# Altium footprint library AltiumDesignerLibraries.PcbLib: 313 footprints (part 16 of 20)
Each footprint in its own frame and in the unit in brackets; x right, y up, seen from the top. Pads: shape width x height; smd on the part's side, far side on the other; paste and mask are expansions set on the pad; w line width, h text height; cw(c..) or ccw(c..) is an arc to the next point about the centre after c.
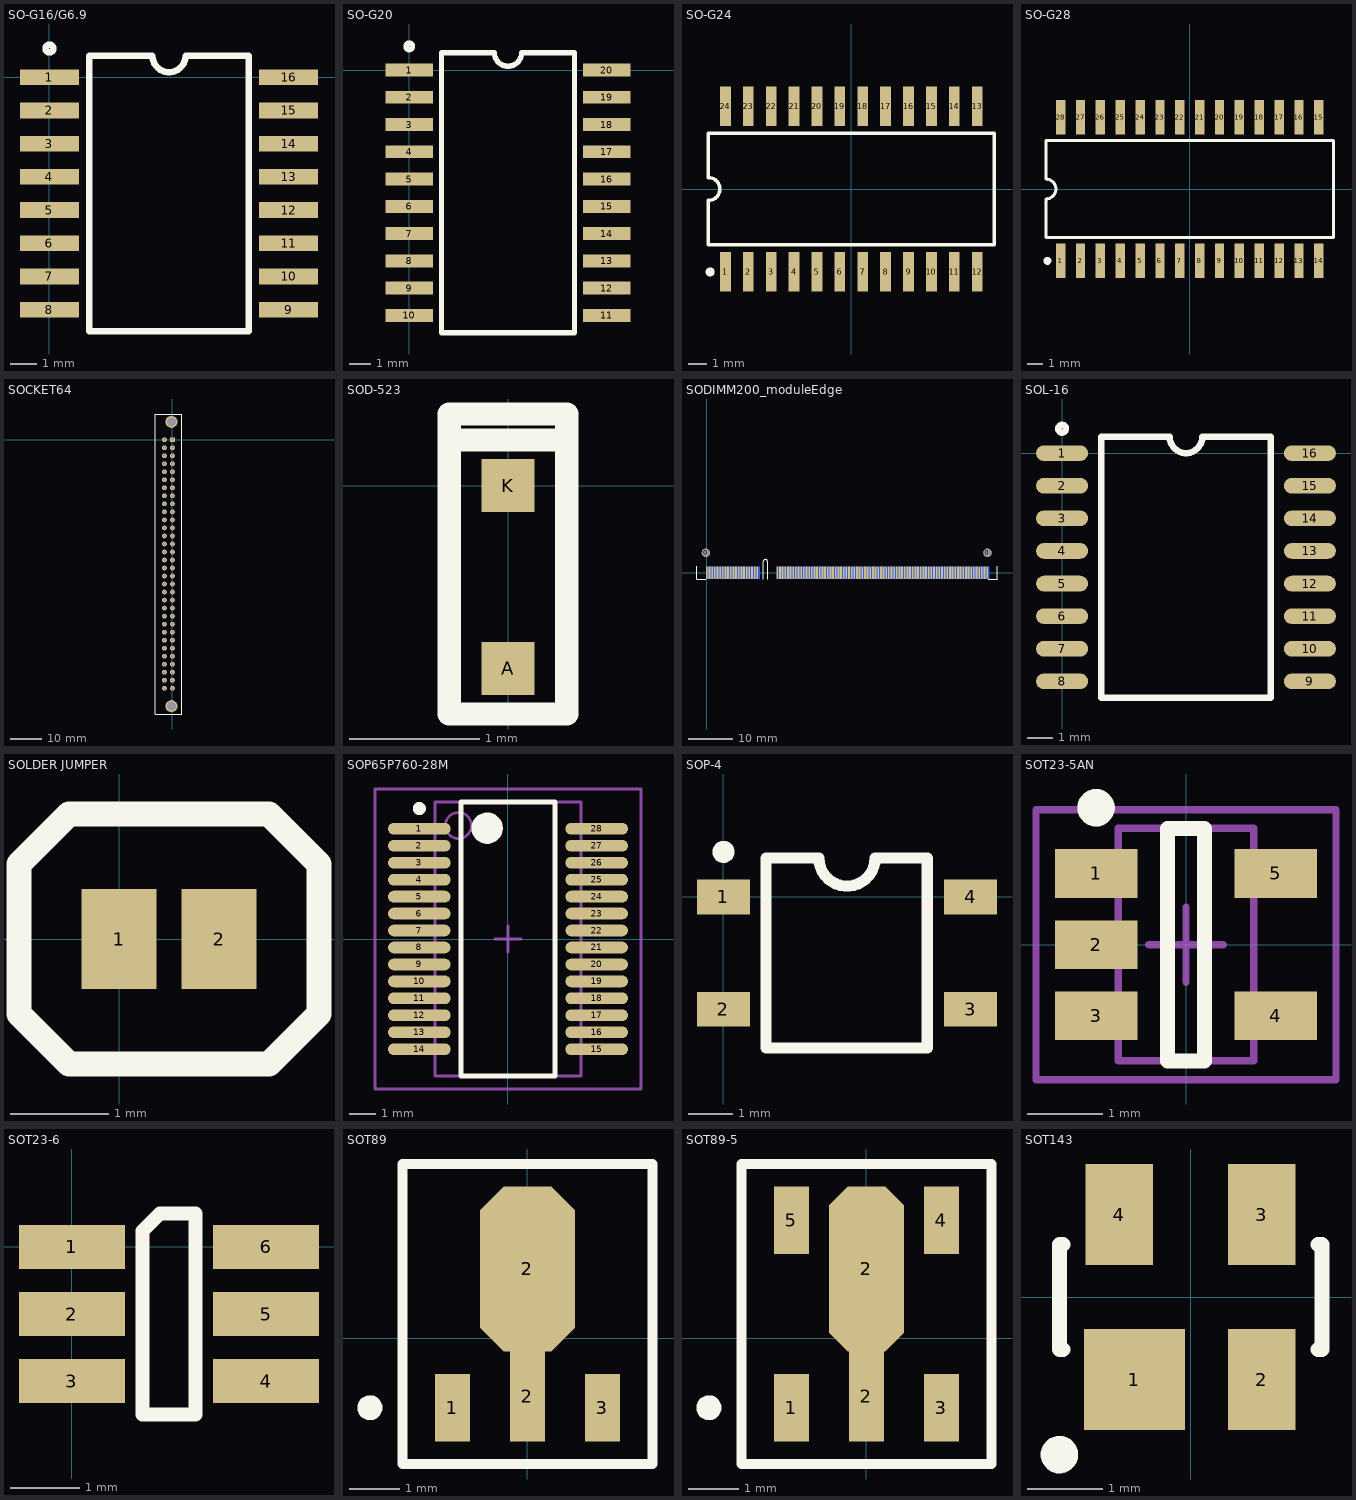
[diagram p15: the footprints below, top view; thin cyan lines are the x and y axes]

## SO-G16/G6.9 [mm]
pads (16):
  rect 2.25x0.6 smd: 1(0,0) 2(0,-1.27) 3(0,-2.54) 4(0,-3.81) 5(0,-5.08) 6(0,-6.35) 7(0,-7.62) 8(0,-8.89) 9(9.15,-8.89) 10(9.15,-7.62) 11(9.15,-6.35) 12(9.15,-5.08) 13(9.15,-3.81) 14(9.15,-2.54) 15(9.15,-1.27) 16(9.15,0)
Top Overlay:
  circle w0.25: c0,1.1 r0.15
  lines w0.25: 1.525,-9.72 1.525,0.83 3.94,0.83 ccw(c4.575,0.83) 5.21,0.83 7.625,0.83 7.625,-9.72 1.525,-9.72

## SO-G20 [mm]
pads (20):
  rect 2.2x0.6 smd: 1(0,0) 2(0,-1.27) 3(0,-2.54) 4(0,-3.81) 5(0,-5.08) 6(0,-6.35) 7(0,-7.62) 8(0,-8.89) 9(0,-10.16) 10(0,-11.43) 11(9.2,-11.43) 12(9.2,-10.16) 13(9.2,-8.89) 14(9.2,-7.62) 15(9.2,-6.35) 16(9.2,-5.08) 17(9.2,-3.81) 18(9.2,-2.54) 19(9.2,-1.27) 20(9.2,0)
Top Overlay:
  circle w0.25: c0,1.1 r0.15
  lines w0.25: 1.5,-12.24 7.7,-12.24 7.7,0.81 5.235,0.81 cw(c4.6,0.81) 3.965,0.81 1.5,0.81 1.5,-12.24

## SO-G24 [mm]
pads (24):
  rect 0.6x2.2 smd: 1(-6.985,-4.6) 2(-5.715,-4.6) 3(-4.445,-4.6) 4(-3.175,-4.6) 5(-1.905,-4.6) 6(-0.635,-4.6) 7(0.635,-4.6) 8(1.905,-4.6) 9(3.175,-4.6) 10(4.445,-4.6) 11(5.715,-4.6) 12(6.985,-4.6) 13(6.985,4.6) 14(5.715,4.6) 15(4.445,4.6) 16(3.175,4.6) 17(1.905,4.6) 18(0.635,4.6) 19(-0.635,4.6) 20(-1.905,4.6) 21(-3.175,4.6) 22(-4.445,4.6) 23(-5.715,4.6) 24(-6.985,4.6)
Top Overlay:
  circle w0.25: c-7.835,-4.6 r0.125
  lines w0.2: -7.925,-3.1 7.925,-3.1 7.925,3.1 -7.925,3.1 -7.925,0.635 cw(c-7.925,0) -7.925,-0.635 -7.925,-3.1

## SO-G28 [mm]
pads (28):
  rect 0.6x2.2 smd: 1(-8.255,-4.6) 2(-6.985,-4.6) 3(-5.715,-4.6) 4(-4.445,-4.6) 5(-3.175,-4.6) 6(-1.905,-4.6) 7(-0.635,-4.6) 8(0.635,-4.6) 9(1.905,-4.6) 10(3.175,-4.6) 11(4.445,-4.6) 12(5.715,-4.6) 13(6.985,-4.6) 14(8.255,-4.6) 15(8.255,4.6) 16(6.985,4.6) 17(5.715,4.6) 18(4.445,4.6) 19(3.175,4.6) 20(1.905,4.6) 21(0.635,4.6) 22(-0.635,4.6) 23(-1.905,4.6) 24(-3.175,4.6) 25(-4.445,4.6) 26(-5.715,4.6) 27(-6.985,4.6) 28(-8.255,4.6)
Top Overlay:
  circle w0.25: c-9.105,-4.6 r0.125
  lines w0.2: -9.2,-3.1 -9.2,-0.635 ccw(c-9.2,0) -9.2,0.635 -9.2,3.1 9.2,3.1 9.2,-3.1 -9.2,-3.1

## SOCKET64 [mil]
pads (66):
  rect 60x60 hole 38: 1(0,0)
  round 60 hole 38: 2(0,-100) 3(0,-200) 4(0,-300) 5(0,-400) 6(0,-500) 7(0,-600) 8(0,-700) 9(0,-800) 10(0,-900) 11(0,-1000) 12(0,-1100) 13(0,-1200) 14(0,-1300) 15(0,-1400) 16(0,-1500) 17(0,-1600) 18(0,-1700) 19(0,-1800) 20(0,-1900) 21(0,-2000) 22(0,-2100) 23(0,-2200) 24(0,-2300) 25(0,-2400) 26(0,-2500) 27(0,-2600) 28(0,-2700) 29(0,-2800) 30(0,-2900) 31(0,-3000) 32(0,-3100) 33(-100,0) 34(-100,-100) 35(-100,-200) 36(-100,-300) 37(-100,-400) 38(-100,-500) 39(-100,-600) 40(-100,-700) 41(-100,-800) 42(-100,-900) 43(-100,-1000) 44(-100,-1100) 45(-100,-1200) 46(-100,-1300) 47(-100,-1400) 48(-100,-1500) 49(-100,-1600) 50(-100,-1700) 51(-100,-1800) 52(-100,-1900) 53(-100,-2000) 54(-100,-2100) 55(-100,-2200) 56(-100,-2300) 57(-100,-2400) 58(-100,-2500) 59(-100,-2600) 60(-100,-2700) 61(-100,-2800) 62(-100,-2900) 63(-100,-3000) 64(-100,-3100)
  round 150 hole 110: SYSPAD65(-12,222) SYSPAD66(-12,-3322)
Top Overlay:
  lines w10: -216,-3420 116,-3420 116,320 -216,320 -216,-3420

## SOD-523 [mil]
height 39.37
pads (2):
  rect 16x16 smd mask+3: A(0,-55.12) K(0,0)
Top Overlay:
  lines w7: 17.72,11.81 17.72,21.65 -17.72,21.65 -17.72,13.78 ; -17.72,13.78 17.72,13.78 17.72,-68.9 -17.72,-68.9 -17.72,13.78

## SODIMM200_moduleEdge [mm]
pads (202):
  round 1.9 hole 1.8: 0(-0.225,4.5) 0(63.375,4.5)
  rect 0.4x2.769 smd: 1(0,0) 3(0.6,0) 5(1.2,0) 7(1.8,0) 9(2.4,0) 11(3,0) 13(3.6,0) 15(4.2,0) 17(4.8,0) 19(5.4,0) 21(6,0) 23(6.6,0) 25(7.2,0) 27(7.8,0) 29(8.4,0) 31(9,0) 33(9.6,0) 35(10.2,0) 37(10.8,0) 39(11.4,0) 41(15.9,0) 43(16.5,0) 45(17.1,0) 47(17.7,0) 49(18.3,0) 51(18.9,0) 53(19.5,0) 55(20.1,0) 57(20.7,0) 59(21.3,0) 61(21.9,0) 63(22.5,0) 65(23.1,0) 67(23.7,0) 69(24.3,0) 71(24.9,0) 73(25.5,0) 75(26.1,0) 77(26.7,0) 79(27.3,0) 81(27.9,0) 83(28.5,0) 85(29.1,0) 87(29.7,0) 89(30.3,0) 91(30.9,0) 93(31.5,0) 95(32.1,0) 97(32.7,0) 99(33.3,0) 101(33.9,0) 103(34.5,0) 105(35.1,0) 107(35.7,0) 109(36.3,0) 111(36.9,0) 113(37.5,0) 115(38.1,0) 117(38.7,0) 119(39.3,0) 121(39.9,0) 123(40.5,0) 125(41.1,0) 127(41.7,0) 129(42.3,0) 131(42.9,0) 133(43.5,0) 135(44.1,0) 137(44.7,0) 139(45.3,0) 141(45.9,0) 143(46.5,0) 145(47.1,0) 147(47.7,0) 149(48.3,0) 151(48.9,0) 153(49.5,0) 155(50.1,0) 157(50.7,0) 159(51.3,0) 161(51.9,0) 163(52.5,0) 165(53.1,0) 167(53.7,0) 169(54.3,0) 171(54.9,0) 173(55.5,0) 175(56.1,0) 177(56.7,0) 179(57.3,0) 181(57.9,0) 183(58.5,0) 185(59.1,0) 187(59.7,0) 189(60.3,0) 191(60.9,0) 193(61.5,0) 195(62.1,0) 197(62.7,0) 199(63.3,0)
  rect 0.4x2.769 smd far side: 2(0.305,0) 4(0.905,0) 6(1.505,0) 8(2.105,0) 10(2.705,0) 12(3.305,0) 14(3.905,0) 16(4.505,0) 18(5.105,0) 20(5.705,0) 22(6.305,0) 24(6.905,0) 26(7.505,0) 28(8.105,0) 30(8.705,0) 32(9.305,0) 34(9.905,0) 36(10.505,0) 38(11.105,0) 40(11.705,0) 42(16.205,0) 44(16.805,0) 46(17.405,0) 48(18.005,0) 50(18.605,0) 52(19.205,0) 54(19.805,0) 56(20.405,0) 58(21.005,0) 60(21.605,0) 62(22.205,0) 64(22.805,0) 66(23.405,0) 68(24.005,0) 70(24.605,0) 72(25.205,0) 74(25.805,0) 76(26.405,0) 78(27.005,0) 80(27.605,0) 82(28.205,0) 84(28.805,0) 86(29.405,0) 88(30.005,0) 90(30.605,0) 92(31.205,0) 94(31.805,0) 96(32.405,0) 98(33.005,0) 100(33.605,0) 102(34.205,0) 104(34.805,0) 106(35.405,0) 108(36.005,0) 110(36.605,0) 112(37.205,0) 114(37.805,0) 116(38.405,0) 118(39.005,0) 120(39.605,0) 122(40.205,0) 124(40.805,0) 126(41.405,0) 128(42.005,0) 130(42.605,0) 132(43.205,0) 134(43.805,0) 136(44.405,0) 138(45.005,0) 140(45.605,0) 142(46.205,0) 144(46.805,0) 146(47.405,0) 148(48.005,0) 150(48.605,0) 152(49.205,0) 154(49.805,0) 156(50.405,0) 158(51.005,0) 160(51.605,0) 162(52.205,0) 164(52.805,0) 166(53.405,0) 168(54.005,0) 170(54.605,0) 172(55.205,0) 174(55.805,0) 176(56.405,0) 178(57.005,0) 180(57.605,0) 182(58.205,0) 184(58.805,0) 186(59.405,0) 188(60.005,0) 190(60.605,0) 192(61.205,0) 194(61.805,0) 196(62.405,0) 198(63.005,0) 200(63.605,0)
Top Overlay:
  lines w0.254: -2.225,1.48 -2.225,-1.5 -0.225,-1.5 ; 12.7,-1.423 12.7,2.5 cw(c13.2,2.5) 13.7,2.5 13.7,-1.428 ; 63.525,-1.5 65.525,-1.5 65.525,1.492

## SOL-16 [mil]
pads (16):
  oval 80x24 smd: 1(0,0) 2(0,-50) 3(0,-100) 4(0,-150) 5(0,-200) 6(0,-250) 7(0,-300) 8(0,-350) 9(380,-350) 10(380,-300) 11(380,-250) 12(380,-200) 13(380,-150) 14(380,-100) 15(380,-50) 16(380,0)
Top Overlay:
  circle w9.84: c0,37.4 r5.91
  lines w10: 60,-375 320,-375 320,25 215,25 cw(c190,25) 165,25 60,25 60,-375

## SOLDER JUMPER [mil]
pads (2):
  rect 30x40 smd: 1(0,0) 2(40,0)
Top Overlay:
  lines w10: -40,-30 -20,-50 60,-50 80,-30 80,30 60,50 -20,50 -40,30 -40,-30

## SOP65P760-28M [mm] "SOP, 28-Leads, Body 10.2x5.3mm, Pitch 0.65mm, IPC Low Density"
height 2
pads (28):
  oval 2.4x0.45 smd: 1(-3.4,4.225) 2(-3.4,3.575) 3(-3.4,2.925) 4(-3.4,2.275) 5(-3.4,1.625) 6(-3.4,0.975) 7(-3.4,0.325) 8(-3.4,-0.325) 9(-3.4,-0.975) 10(-3.4,-1.625) 11(-3.4,-2.275) 12(-3.4,-2.925) 13(-3.4,-3.575) 14(-3.4,-4.225) 15(3.4,-4.225) 16(3.4,-3.575) 17(3.4,-2.925) 18(3.4,-2.275) 19(3.4,-1.625) 20(3.4,-0.975) 21(3.4,-0.325) 22(3.4,0.325) 23(3.4,0.975) 24(3.4,1.625) 25(3.4,2.275) 26(3.4,2.925) 27(3.4,3.575) 28(3.4,4.225)
Top Overlay:
  circle w0.25: c-3.4,5 r0.125
  circle w0.6: c-0.8,4.25 r0.3
  lines w0.2: -1.8,-5.25 -1.8,5.25 1.8,5.25 1.8,-5.25 -1.8,-5.25
Mechanical 13:
  circle w0.1: c-1.9,4.35 r0.5
  lines w0.1: -2.8,-5.25 -2.8,5.25 2.8,5.25 2.8,-5.25 -2.8,-5.25
Mechanical 15:
  lines w0.1: -0.5,0 0.5,0 ; 0,-0.5 0,0.5 ; -5.1,-5.75 -5.1,5.75 5.1,5.75 5.1,-5.75 -5.1,-5.75
3D body: height 2, standoff 0, extent -2.8,-5.25 2.8,5.25

## SOP-4 [mil]
pads (4):
  rect 47x31 smd: 1(0,0) 2(0,-100) 3(220,-100) 4(220,0)
Top Overlay:
  circle w9.84: c0.08,40 r4.92
  lines w10: 38,-134.5 38,34.5 85,34.5 ccw(c110,34.5) 135,34.5 181.5,34.5 181.5,-134.5 38,-134.5

## SOT23-5AN [mm] "SOT23, 5-Leads, Body 2.9x1.6mm, Pitch 0.95mm, Lead Span 2.8mm, IPC Medium Density"
height 1.45
pads (5):
  rect 1.1x0.65 smd: 1(-1.2,0.95) 2(-1.2,0) 3(-1.2,-0.95) 4(1.2,-0.95) 5(1.2,0.95)
Top Overlay:
  circle w0.25: c-1.2,1.825 r0.125
  lines w0.2: -0.25,-1.55 -0.25,1.55 0.25,1.55 0.25,-1.55 -0.25,-1.55
Mechanical 13:
  lines w0.1: -0.9,-1.55 0.9,-1.55 0.9,1.55 -0.9,1.55 -0.9,-1.55
Mechanical 15:
  lines w0.1: -0.5,0 0.5,0 ; 0,-0.5 0,0.5 ; -2,-1.8 2,-1.8 2,1.8 -2,1.8 -2,-1.8
3D body: height 1.45, standoff 0, extent -0.9,-1.55 0.9,1.55

## SOT23-6 [mil]
height 39.37
pads (6):
  rect 60x25 smd mask+3: 1(0,0) 2(0,-38) 3(0,-76) 4(110,-76) 5(110,-38) 6(110,0)
Top Overlay:
  lines w8: 40,-95 40,9 50,19 70,19 70,-95 40,-95

## SOT89 [mm]
pads (4):
  rect 0.7x1.35 smd: 1(-1.5,-1.388) 3(1.5,-1.388)
  rect 0.7x1.8 smd: 2(0,-1.162)
  oct 1.9x3.3 smd: 2(0,1.388)
Top Overlay:
  circle w0.25: c-3.15,-1.388 r0.125
  lines w0.2: -2.5,-2.512 -2.5,3.487 2.5,3.487 2.5,-2.512 -2.5,-2.512

## SOT89-5 [mm]
pads (6):
  rect 0.7x1.35 smd: 1(-1.5,-1.388) 3(1.5,-1.388) 4(1.5,2.362) 5(-1.5,2.362)
  rect 0.7x1.8 smd: 2(0,-1.162)
  oct 1.5x3.3 smd: 2(0,1.388)
Top Overlay:
  circle w0.25: c-3.15,-1.388 r0.125
  lines w0.2: -2.5,-2.512 -2.5,3.487 2.5,3.487 2.5,-2.512 -2.5,-2.512

## SOT143 [mm]
pads (4):
  rect 1.35x1.35 smd: 1(-0.75,-1.1)
  rect 0.9x1.35 smd: 2(0.95,-1.1) 3(0.95,1.1) 4(-0.95,1.1)
Top Overlay:
  circle w0.25: c-1.75,-2.1 r0.125
  lines w0.2: -1.7,-0.7 -1.75,-0.7 -1.75,0.7 -1.7,0.7 ; 1.7,-0.7 1.75,-0.7 1.75,0.7 1.7,0.7